# Altium footprint library IntLib.PcbLib: 221 footprints (part 6 of 14)
Each footprint in its own frame and in the unit in brackets; x right, y up, seen from the top. Pads: shape width x height; smd on the part's side, far side on the other; paste and mask are expansions set on the pad; w line width, h text height; cw(c..) or ccw(c..) is an arc to the next point about the centre after c.
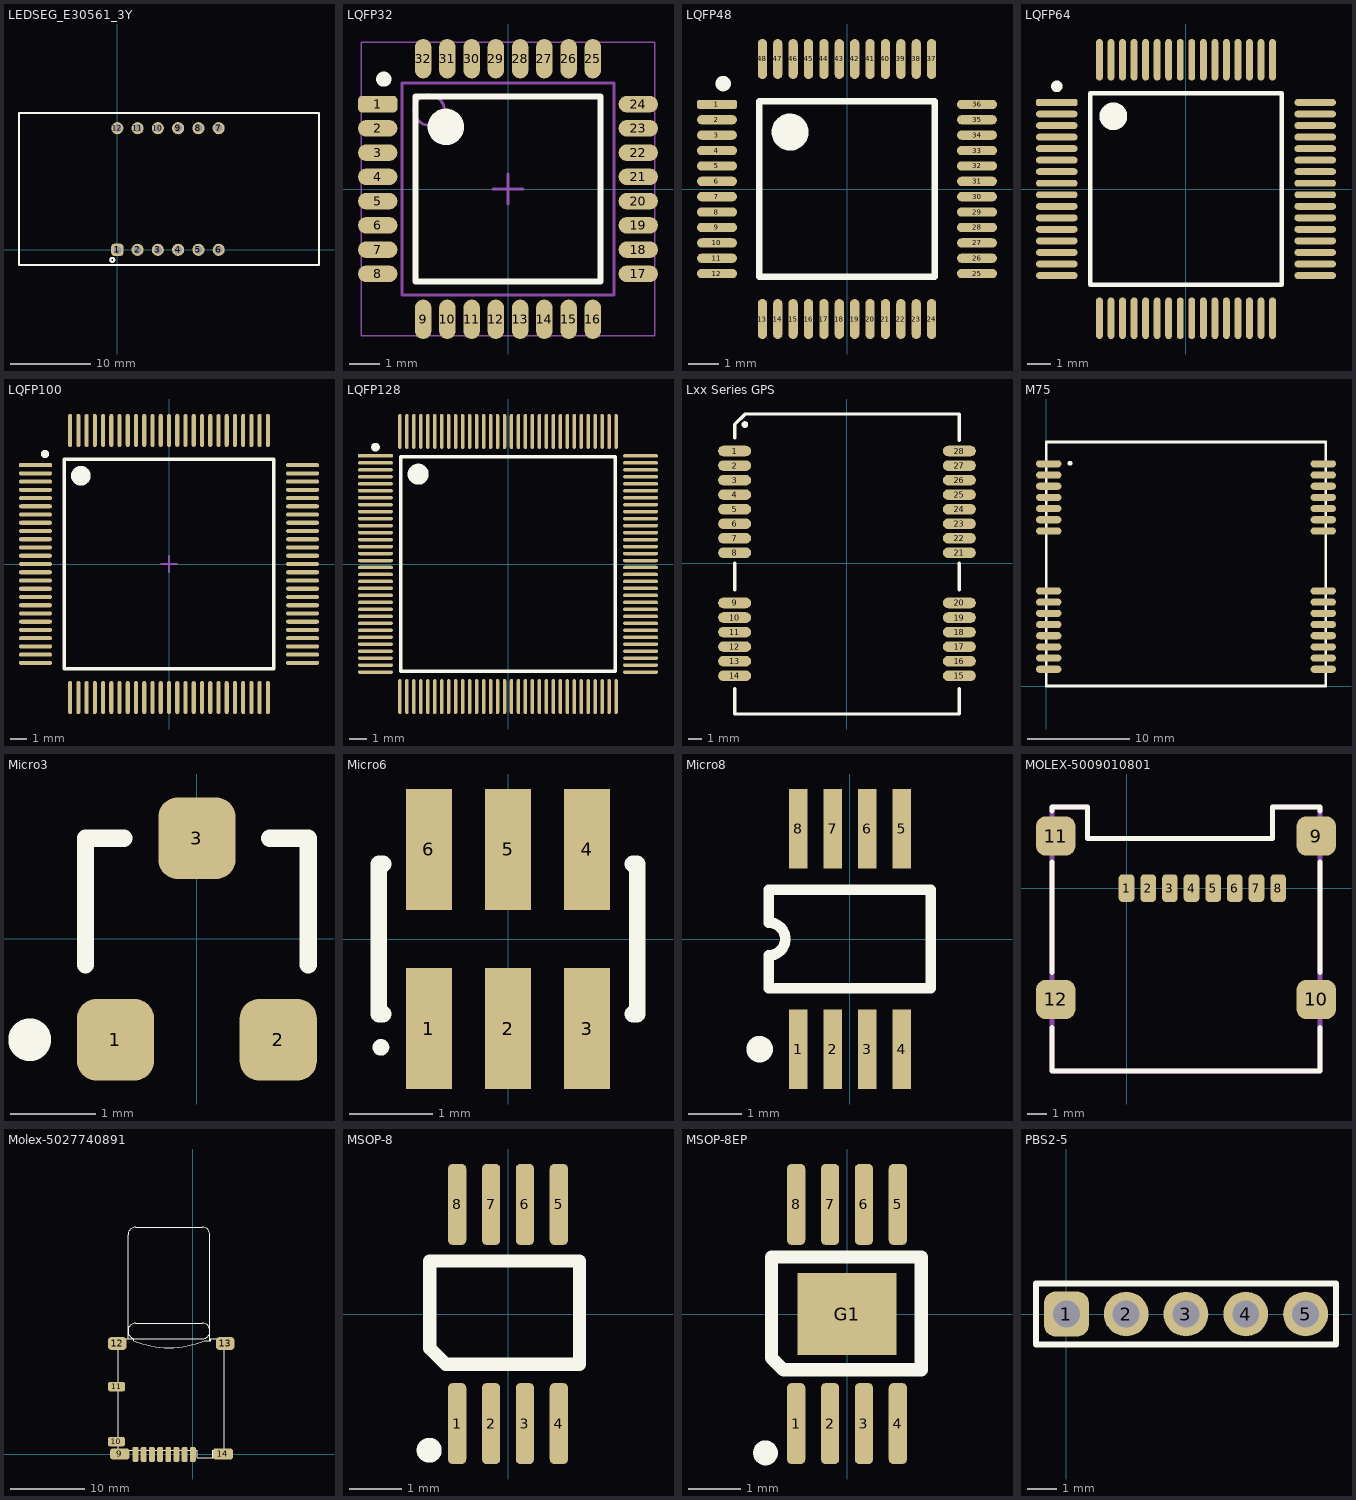
[diagram p5: the footprints below, top view; thin cyan lines are the x and y axes]

## LEDSEG_E30561_3Y [mil] "LED 7-SEG 3-DIGIT"
height 551.18
pads (12):
  rrect50% 60x60 hole 39.37: 1(0,0)
  round 60 hole 39.37: 2(100,0) 3(200,0) 4(300,0) 5(400,0) 6(500,0) 7(500,600) 8(400,600) 9(300,600) 10(200,600) 11(100,600) 12(0,600)
Top Overlay:
  circle w10: c-25,-50 r10
  lines w10: -485,-75 995,-75 995,675 -485,675 -485,-75
3D body: height 318.9, standoff -216.54, extent -490.16,-75 990.16,673.03

## LQFP32 [mm] "QFP, 32-Leads, Body 7x7mm, Pitch 0.8mm, IPC High Density"
height 1.6
pads (32):
  rrect50% 1.3x0.55 smd: 1(-4.3,2.8)
  oval 1.3x0.55 smd: 2(-4.3,2) 3(-4.3,1.2) 4(-4.3,0.4) 5(-4.3,-0.4) 6(-4.3,-1.2) 7(-4.3,-2) 8(-4.3,-2.8) 17(4.3,-2.8) 18(4.3,-2) 19(4.3,-1.2) 20(4.3,-0.4) 21(4.3,0.4) 22(4.3,1.2) 23(4.3,2) 24(4.3,2.8)
  oval 0.55x1.3 smd: 9(-2.8,-4.3) 10(-2,-4.3) 11(-1.2,-4.3) 12(-0.4,-4.3) 13(0.4,-4.3) 14(1.2,-4.3) 15(2,-4.3) 16(2.8,-4.3) 25(2.8,4.3) 26(2,4.3) 27(1.2,4.3) 28(0.4,4.3) 29(-0.4,4.3) 30(-1.2,4.3) 31(-2,4.3) 32(-2.8,4.3)
Top Overlay:
  circle w0.6: c-2.05,2.05 r0.3
  circle w0.25: c-4.1,3.625 r0.125
  lines w0.2: -3.05,-3.05 3.05,-3.05 3.05,3.05 -3.05,3.05 -3.05,-3.05
Mechanical 13:
  circle w0.1: c-2.6,2.6 r0.5
  lines w0.1: -3.5,-3.5 3.5,-3.5 3.5,3.5 -3.5,3.5 -3.5,-3.5
Mechanical 15:
  lines w0.05: -4.85,-4.85 4.85,-4.85 4.85,4.85 -4.85,4.85 -4.85,-4.85
  lines w0.1: -0.5,0 0.5,0 ; 0,-0.5 0,0.5
3D body: height 1.63, standoff -0.09, extent -4.504,-4.5 4.496,4.5

## LQFP48 [mm] "Thin QFP, 48-Leads, Body 7x7mm, Pitch 0.5mm, IPC High Density"
height 1.6
pads (48):
  rrect50% 1.3x0.3 smd: 1(-4.225,2.75)
  oval 1.3x0.3 smd: 2(-4.225,2.25) 3(-4.225,1.75) 4(-4.225,1.25) 5(-4.225,0.75) 6(-4.225,0.25) 7(-4.225,-0.25) 8(-4.225,-0.75) 9(-4.225,-1.25) 10(-4.225,-1.75) 11(-4.225,-2.25) 12(-4.225,-2.75) 25(4.225,-2.75) 26(4.225,-2.25) 27(4.225,-1.75) 28(4.225,-1.25) 29(4.225,-0.75) 30(4.225,-0.25) 31(4.225,0.25) 32(4.225,0.75) 33(4.225,1.25) 34(4.225,1.75) 35(4.225,2.25) 36(4.225,2.75)
  oval 0.3x1.3 smd: 13(-2.75,-4.225) 14(-2.25,-4.225) 15(-1.75,-4.225) 16(-1.25,-4.225) 17(-0.75,-4.225) 18(-0.25,-4.225) 19(0.25,-4.225) 20(0.75,-4.225) 21(1.25,-4.225) 22(1.75,-4.225) 23(2.25,-4.225) 24(2.75,-4.225) 37(2.75,4.225) 38(2.25,4.225) 39(1.75,4.225) 40(1.25,4.225) 41(0.75,4.225) 42(0.25,4.225) 43(-0.25,4.225) 44(-0.75,4.225) 45(-1.25,4.225) 46(-1.75,4.225) 47(-2.25,4.225) 48(-2.75,4.225)
Top Overlay:
  circle w0.6: c-1.85,1.85 r0.3
  circle w0.25: c-4.025,3.425 r0.125
  lines w0.2: -2.85,-2.85 2.85,-2.85 2.85,2.85 -2.85,2.85 -2.85,-2.85
3D body: height 1.5, standoff 0, extent -4.5,-4.5 4.5,4.5

## LQFP64 [mm] "Thin QFP, 64-Leads, Body 10x10mm, Pitch 0.5mm, IPC Low Density"
height 1.6
pads (64):
  rrect50% 1.8x0.3 smd: 1(-5.6,3.75)
  oval 1.8x0.3 smd: 2(-5.6,3.25) 3(-5.6,2.75) 4(-5.6,2.25) 5(-5.6,1.75) 6(-5.6,1.25) 7(-5.6,0.75) 8(-5.6,0.25) 9(-5.6,-0.25) 10(-5.6,-0.75) 11(-5.6,-1.25) 12(-5.6,-1.75) 13(-5.6,-2.25) 14(-5.6,-2.75) 15(-5.6,-3.25) 16(-5.6,-3.75) 33(5.6,-3.75) 34(5.6,-3.25) 35(5.6,-2.75) 36(5.6,-2.25) 37(5.6,-1.75) 38(5.6,-1.25) 39(5.6,-0.75) 40(5.6,-0.25) 41(5.6,0.25) 42(5.6,0.75) 43(5.6,1.25) 44(5.6,1.75) 45(5.6,2.25) 46(5.6,2.75) 47(5.6,3.25) 48(5.6,3.75)
  oval 0.3x1.8 smd: 17(-3.75,-5.6) 18(-3.25,-5.6) 19(-2.75,-5.6) 20(-2.25,-5.6) 21(-1.75,-5.6) 22(-1.25,-5.6) 23(-0.75,-5.6) 24(-0.25,-5.6) 25(0.25,-5.6) 26(0.75,-5.6) 27(1.25,-5.6) 28(1.75,-5.6) 29(2.25,-5.6) 30(2.75,-5.6) 31(3.25,-5.6) 32(3.75,-5.6) 49(3.75,5.6) 50(3.25,5.6) 51(2.75,5.6) 52(2.25,5.6) 53(1.75,5.6) 54(1.25,5.6) 55(0.75,5.6) 56(0.25,5.6) 57(-0.25,5.6) 58(-0.75,5.6) 59(-1.25,5.6) 60(-1.75,5.6) 61(-2.25,5.6) 62(-2.75,5.6) 63(-3.25,5.6) 64(-3.75,5.6)
Top Overlay:
  circle w0.25: c-5.6,4.45 r0.125
  circle w0.6: c-3.15,3.15 r0.3
  lines w0.2: -4.15,-4.15 -4.15,4.15 4.15,4.15 4.15,-4.15 -4.15,-4.15
3D body: height 1.6, standoff 0, extent -6,-6 6,6

## LQFP100 [mm] "Thin QFP, 100-Leads, Body 14x14mm, Pitch 0.5mm, IPC High Density"
height 1.6
pads (100):
  rrect50% 2x0.25 smd: 1(-8.1,6)
  oval 2x0.25 smd: 2(-8.1,5.5) 3(-8.1,5) 4(-8.1,4.5) 5(-8.1,4) 6(-8.1,3.5) 7(-8.1,3) 8(-8.1,2.5) 9(-8.1,2) 10(-8.1,1.5) 11(-8.1,1) 12(-8.1,0.5) 13(-8.1,0) 14(-8.1,-0.5) 15(-8.1,-1) 16(-8.1,-1.5) 17(-8.1,-2) 18(-8.1,-2.5) 19(-8.1,-3) 20(-8.1,-3.5) 21(-8.1,-4) 22(-8.1,-4.5) 23(-8.1,-5) 24(-8.1,-5.5) 25(-8.1,-6) 51(8.1,-6) 52(8.1,-5.5) 53(8.1,-5) 54(8.1,-4.5) 55(8.1,-4) 56(8.1,-3.5) 57(8.1,-3) 58(8.1,-2.5) 59(8.1,-2) 60(8.1,-1.5) 61(8.1,-1) 62(8.1,-0.5) 63(8.1,0) 64(8.1,0.5) 65(8.1,1) 66(8.1,1.5) 67(8.1,2) 68(8.1,2.5) 69(8.1,3) 70(8.1,3.5) 71(8.1,4) 72(8.1,4.5) 73(8.1,5) 74(8.1,5.5) 75(8.1,6)
  oval 0.25x2 smd: 26(-6,-8.1) 27(-5.5,-8.1) 28(-5,-8.1) 29(-4.5,-8.1) 30(-4,-8.1) 31(-3.5,-8.1) 32(-3,-8.1) 33(-2.5,-8.1) 34(-2,-8.1) 35(-1.5,-8.1) 36(-1,-8.1) 37(-0.5,-8.1) 38(0,-8.1) 39(0.5,-8.1) 40(1,-8.1) 41(1.5,-8.1) 42(2,-8.1) 43(2.5,-8.1) 44(3,-8.1) 45(3.5,-8.1) 46(4,-8.1) 47(4.5,-8.1) 48(5,-8.1) 49(5.5,-8.1) 50(6,-8.1) 76(6,8.1) 77(5.5,8.1) 78(5,8.1) 79(4.5,8.1) 80(4,8.1) 81(3.5,8.1) 82(3,8.1) 83(2.5,8.1) 84(2,8.1) 85(1.5,8.1) 86(1,8.1) 87(0.5,8.1) 88(0,8.1) 89(-0.5,8.1) 90(-1,8.1) 91(-1.5,8.1) 92(-2,8.1) 93(-2.5,8.1) 94(-3,8.1) 95(-3.5,8.1) 96(-4,8.1) 97(-4.5,8.1) 98(-5,8.1) 99(-5.5,8.1) 100(-6,8.1)
Top Overlay:
  circle w0.6: c-5.35,5.35 r0.3
  circle w0.25: c-7.525,6.675 r0.125
  lines w0.2: -6.35,-6.35 6.35,-6.35 6.35,6.35 -6.35,6.35 -6.35,-6.35
Mechanical 15:
  lines w0.1: -0.5,0 0.5,0 ; 0,-0.5 0,0.5
3D body: height 1.7, standoff -0.01, extent -8,-8 8,8

## LQFP128 [mm] "Thin QFP, 128Leads, Body 14x14mm, Pitch 0.4mm, IPC Low Density"
height 1.6
pads (128):
  rrect50% 2x0.2 smd: 1(-7.6,6.2)
  oval 2x0.2 smd: 2(-7.6,5.8) 3(-7.6,5.4) 4(-7.6,5) 5(-7.6,4.6) 6(-7.6,4.2) 7(-7.6,3.8) 8(-7.6,3.4) 9(-7.6,3) 10(-7.6,2.6) 11(-7.6,2.2) 12(-7.6,1.8) 13(-7.6,1.4) 14(-7.6,1) 15(-7.6,0.6) 16(-7.6,0.2) 17(-7.6,-0.2) 18(-7.6,-0.6) 19(-7.6,-1) 20(-7.6,-1.4) 21(-7.6,-1.8) 22(-7.6,-2.2) 23(-7.6,-2.6) 24(-7.6,-3) 25(-7.6,-3.4) 26(-7.6,-3.8) 27(-7.6,-4.2) 28(-7.6,-4.6) 29(-7.6,-5) 30(-7.6,-5.4) 31(-7.6,-5.8) 32(-7.6,-6.2) 65(7.6,-6.2) 66(7.6,-5.8) 67(7.6,-5.4) 68(7.6,-5) 69(7.6,-4.6) 70(7.6,-4.2) 71(7.6,-3.8) 72(7.6,-3.4) 73(7.6,-3) 74(7.6,-2.6) 75(7.6,-2.2) 76(7.6,-1.8) 77(7.6,-1.4) 78(7.6,-1) 79(7.6,-0.6) 80(7.6,-0.2) 81(7.6,0.2) 82(7.6,0.6) 83(7.6,1) 84(7.6,1.4) 85(7.6,1.8) 86(7.6,2.2) 87(7.6,2.6) 88(7.6,3) 89(7.6,3.4) 90(7.6,3.8) 91(7.6,4.2) 92(7.6,4.6) 93(7.6,5) 94(7.6,5.4) 95(7.6,5.8) 96(7.6,6.2)
  oval 0.2x2 smd: 33(-6.2,-7.6) 34(-5.8,-7.6) 35(-5.4,-7.6) 36(-5,-7.6) 37(-4.6,-7.6) 38(-4.2,-7.6) 39(-3.8,-7.6) 40(-3.4,-7.6) 41(-3,-7.6) 42(-2.6,-7.6) 43(-2.2,-7.6) 44(-1.8,-7.6) 45(-1.4,-7.6) 46(-1,-7.6) 47(-0.6,-7.6) 48(-0.2,-7.6) 49(0.2,-7.6) 50(0.6,-7.6) 51(1,-7.6) 52(1.4,-7.6) 53(1.8,-7.6) 54(2.2,-7.6) 55(2.6,-7.6) 56(3,-7.6) 57(3.4,-7.6) 58(3.8,-7.6) 59(4.2,-7.6) 60(4.6,-7.6) 61(5,-7.6) 62(5.4,-7.6) 63(5.8,-7.6) 64(6.2,-7.6) 97(6.2,7.6) 98(5.8,7.6) 99(5.4,7.6) 100(5,7.6) 101(4.6,7.6) 102(4.2,7.6) 103(3.8,7.6) 104(3.4,7.6) 105(3,7.6) 106(2.6,7.6) 107(2.2,7.6) 108(1.8,7.6) 109(1.4,7.6) 110(1,7.6) 111(0.6,7.6) 112(0.2,7.6) 113(-0.2,7.6) 114(-0.6,7.6) 115(-1,7.6) 116(-1.4,7.6) 117(-1.8,7.6) 118(-2.2,7.6) 119(-2.6,7.6) 120(-3,7.6) 121(-3.4,7.6) 122(-3.8,7.6) 123(-4.2,7.6) 124(-4.6,7.6) 125(-5,7.6) 126(-5.4,7.6) 127(-5.8,7.6) 128(-6.2,7.6)
Top Overlay:
  circle w0.25: c-7.6,6.7 r0.125
  circle w0.6: c-5.15,5.15 r0.3
  lines w0.2: -6.15,-6.15 -6.15,6.15 6.15,6.15 6.15,-6.15 -6.15,-6.15
3D body: height 1.35, standoff 0, extent -8,-8 8,8

## Lxx Series GPS [mm]
height 3.2
pads (28):
  oval 2.5x0.8 smd: 1(-8.5,8.5) 2(-8.5,7.4) 3(-8.5,6.3) 4(-8.5,5.2) 5(-8.5,4.1) 6(-8.5,3) 7(-8.5,1.9) 8(-8.5,0.8) 9(-8.5,-3) 10(-8.5,-4.1) 11(-8.5,-5.2) 12(-8.5,-6.3) 13(-8.5,-7.4) 14(-8.5,-8.5) 15(8.5,-8.5) 16(8.5,-7.4) 17(8.5,-6.3) 18(8.5,-5.2) 19(8.5,-4.1) 20(8.5,-3) 21(8.5,0.8) 22(8.5,1.9) 23(8.5,3) 24(8.5,4.1) 25(8.5,5.2) 26(8.5,6.3) 27(8.5,7.4) 28(8.5,8.5)
Top Overlay:
  circle w0.254: c-7.727,10.5 r0.127
  lines w0.254: -8.5,-9.5 -8.5,-11.4 8.5,-11.4 8.5,-9.5 ; -8.5,-2 -8.5,0 ; -8.5,9.5 -8.5,10.5 ; -8.45,10.55 -7.7,11.3 8.5,11.3 8.5,9.3 ; 8.5,-2 8.5,0
3D body: height 3.17, standoff 0, extent -8.357,-11.352 8.643,11.048

## M75 [mm] "quectel v1.0"
pads (30):
  oval 2.5x0.7 smd: 1(0.25,21.85) 2(0.25,20.75) 3(0.25,19.65) 4(0.25,18.55) 5(0.25,17.45) 6(0.25,16.35) 7(0.25,15.25) 8(0.25,9.35) 9(0.25,8.25) 10(0.25,7.15) 11(0.25,6.05) 12(0.25,4.95) 13(0.25,3.85) 14(0.25,2.75) 15(0.25,1.65) 16(27.25,1.65) 17(27.25,2.75) 18(27.25,3.85) 19(27.25,4.95) 20(27.25,6.05) 21(27.25,7.15) 22(27.25,8.25) 23(27.25,9.35) 24(27.25,15.25) 25(27.25,16.35) 26(27.25,17.45) 27(27.25,18.55) 28(27.25,19.65) 29(27.25,20.75) 30(27.25,21.85)
Top Overlay:
  circle w0.254: c2.35,21.9 r0.112
  lines w0.254: 0,0 0,24 27.5,24 27.5,0 0,0
3D body: height 3.6, standoff -0.01, extent 0.337,-0.302 27.857,23.698

## Micro3 [mm] "SOT-23; 3 Leads; Body 3.0 x 2.5 mm, inc. leads (LxW max)"
height 1.12
pads (3):
  rrect50% 0.9x0.95 smd: 1(-0.95,-1.175) 2(0.95,-1.175) 3(0,1.175)
Top Overlay:
  circle w0.25: c-1.95,-1.175 r0.125
  lines w0.2: -1.3,-0.3 -1.3,1.175 -0.85,1.175 ; 0.85,1.175 1.3,1.175 1.3,-0.3
3D body: height 1, standoff -0.02, extent -1.458,-1.429 1.462,1.047

## Micro6 [mm] "SOT-457/SC-74; 6 Leads; Body 3 x 3 mm, inc. leads (LxW max)"
height 1.45
pads (6):
  rect 0.55x1.45 smd: 1(-0.95,-1.075) 2(0,-1.075) 3(0.95,-1.075) 4(0.95,1.075) 5(0,1.075) 6(-0.95,1.075)
Top Overlay:
  circle w0.1: c-1.525,-1.3 r0.05
  lines w0.2: -1.5,-0.9 -1.55,-0.9 -1.55,0.9 -1.5,0.9 ; 1.5,-0.9 1.55,-0.9 1.55,0.9 1.5,0.9
3D body: height 1, standoff 0, extent -1.5,-1.346 1.5,1.354

## Micro8 [mm] "Shrink Small Outline; 8 Leads; Body Width 3 mm; Pitch 0.65 mm"
height 1.11
pads (8):
  rect 0.35x1.5 smd: 1(-0.975,-2.075) 2(-0.325,-2.075) 3(0.325,-2.075) 4(0.975,-2.075) 5(0.975,2.075) 6(0.325,2.075) 7(-0.325,2.075) 8(-0.975,2.075)
Top Overlay:
  circle w0.25: c-1.7,-2.075 r0.125
  lines w0.2: -1.525,-0.925 -1.525,-0.308 ccw(c-1.525,0) -1.525,0.308 -1.525,0.925 1.525,0.925 1.525,-0.925 -1.525,-0.925
3D body: height 0.9, standoff -0.1, extent -1.501,-2.436 1.499,2.464

## MOLEX-5009010801 [mm]
pads (12):
  rrect50% 0.8x1.4 smd: 1(0,0) 2(1.1,0) 3(2.2,0) 4(3.3,0) 5(4.4,0) 6(5.5,0) 7(6.6,0) 8(7.7,0)
  rrect50% 2x2 smd: 9(9.639,2.65) 10(9.639,-5.65) 11(-3.6,2.65) 12(-3.6,-5.65)
Top Overlay:
  lines w0.254: -3.78,-7.08 -3.78,-9.28 9.82,-9.28 9.82,-7.08 ; -3.78,-4.28 -3.78,1.32 ; -3.78,3.92 -3.78,4.12 -1.98,4.12 -1.98,2.52 7.42,2.52 7.42,4.12 9.82,4.12 9.82,3.92 ; 9.82,-4.28 9.82,1.32
Mechanical 1:
  lines w0.254: -3.78,-9.28 -3.78,4.12 -1.98,4.12 -1.98,2.52 7.42,2.52 7.42,4.12 9.82,4.12 9.82,-9.28 -3.78,-9.28
3D body: height 1.93, standoff -0.02, extent -4.125,-9.246 10.475,5.254

## Molex-5027740891 [mm] "Molex MicroSD SMD"
height 1.9
pads (14):
  rrect50% 0.8x2 smd: 1(0,0) 2(-1.1,0) 3(-2.2,0) 4(-3.3,0) 5(-4.4,0) 6(-5.5,0) 7(-6.6,0) 8(-7.7,0)
  rrect50% 2.6x1.5 smd: 9(-9.81,0.07)
  rrect50% 2.3x1.3 smd: 10(-10.26,1.72) 11(-10.25,9.12)
  rrect50% 2.5x1.7 smd: 12(-10.15,14.92) 13(4.35,14.92)
  rrect50% 2.7x1.5 smd: 14(4.05,0.07)
Top Overlay:
  lines w0.1: -9.81,0.545 -9.81,-0.155 ccw(c-9.51,-0.155) -9.51,-0.455 -9.11,-0.455 ccw(c-9.11,-0.155) -8.81,-0.155 -8.81,0.545 ; -8.7,15.545 -8.7,16.645 cw(c-7.7,16.645) -7.7,17.645 1.3,17.645 cw(c1.3,16.645) 2.3,16.645 2.3,15.295 ; 3,0.545 3,-0.155 ccw(c3.3,-0.155) 3.3,-0.455 3.8,-0.455 ccw(c3.8,-0.155) 4.1,-0.155 4.1,0.545 ; -10.05,0.545 -10.05,15.345 -9.85,15.345 -9.85,15.545 -7.95,15.545 -7.95,15.295 ccw(c-3.2,26.695) 1.55,15.295 2.405,15.295 2.405,15.545 4.05,15.545 4.05,15.345 4.25,15.345 4.25,0.545 2.7,0.545 2.7,-0.455 0.6,-0.455 0.6,0.545 -10.05,0.545 ; -8.7,16.545 ccw(c-7.7,16.545) -7.7,15.545 1.3,15.545 ccw(c1.3,16.545) 2.3,16.545 2.3,29.545 ccw(c1.3,29.545) 1.3,30.545 -7.7,30.545 ccw(c-7.7,29.545) -8.7,29.545 -8.7,16.545
3D body: height 1.83, standoff 0.03, extent -10.084,-0.38 4.216,15.62

## MSOP-8 [mm]
pads (8):
  rrect50% 0.35x1.55 smd: 1(-0.975,-2.1) 2(-0.325,-2.1) 3(0.325,-2.1) 4(0.975,-2.1) 5(0.975,2.1) 6(0.325,2.1) 7(-0.325,2.1) 8(-0.975,2.1)
Top Overlay:
  circle w0.254: c-1.511,-2.611 r0.112
  lines w0.254: -1.499,-0.66 -1.499,1.016 1.372,1.016 1.372,-0.965 -1.194,-0.965 -1.499,-0.66
3D body: height 1.09, standoff -0.01, extent -1.5,-2.5 1.5,2.5

## MSOP-8EP [mm]
pads (9):
  rrect50% 0.35x1.55 smd: 1(-0.975,-2.1) 2(-0.325,-2.1) 3(0.325,-2.1) 4(0.975,-2.1) 5(0.975,2.1) 6(0.325,2.1) 7(-0.325,2.1) 8(-0.975,2.1)
  rect 1.89x1.57 smd: G1(0,0)
Top Overlay:
  circle w0.254: c-1.562,-2.662 r0.112
  lines w0.254: -1.448,-0.838 -1.448,1.092 1.422,1.092 1.422,-1.067 -1.219,-1.067 -1.448,-0.838
3D body: height 1.09, standoff -0.01, extent -1.5,-2.5 1.5,2.5

## PBS2-5 [mm] "Connector; Header; 5x1 2.00mm"
pads (5):
  rrect50% 1.5x1.5 hole 0.9: 1(0,0)
  round 1.5 hole 0.9: 2(2,0) 3(4,0) 4(6,0) 5(8,0)
Top Overlay:
  lines w0.2: -1.016,-1.016 -1.016,1.016 9.017,1.016 9.017,-1.016 -1.016,-1.016
3D body: height 4.4, standoff -3.05, extent -1.016,-1.016 8.984,0.984